# Altium footprint library PART.PcbLib: 407 footprints (part 22 of 26)
Each footprint in its own frame and in the unit in brackets; x right, y up, seen from the top. Pads: shape width x height; smd on the part's side, far side on the other; paste and mask are expansions set on the pad; w line width, h text height; cw(c..) or ccw(c..) is an arc to the next point about the centre after c.
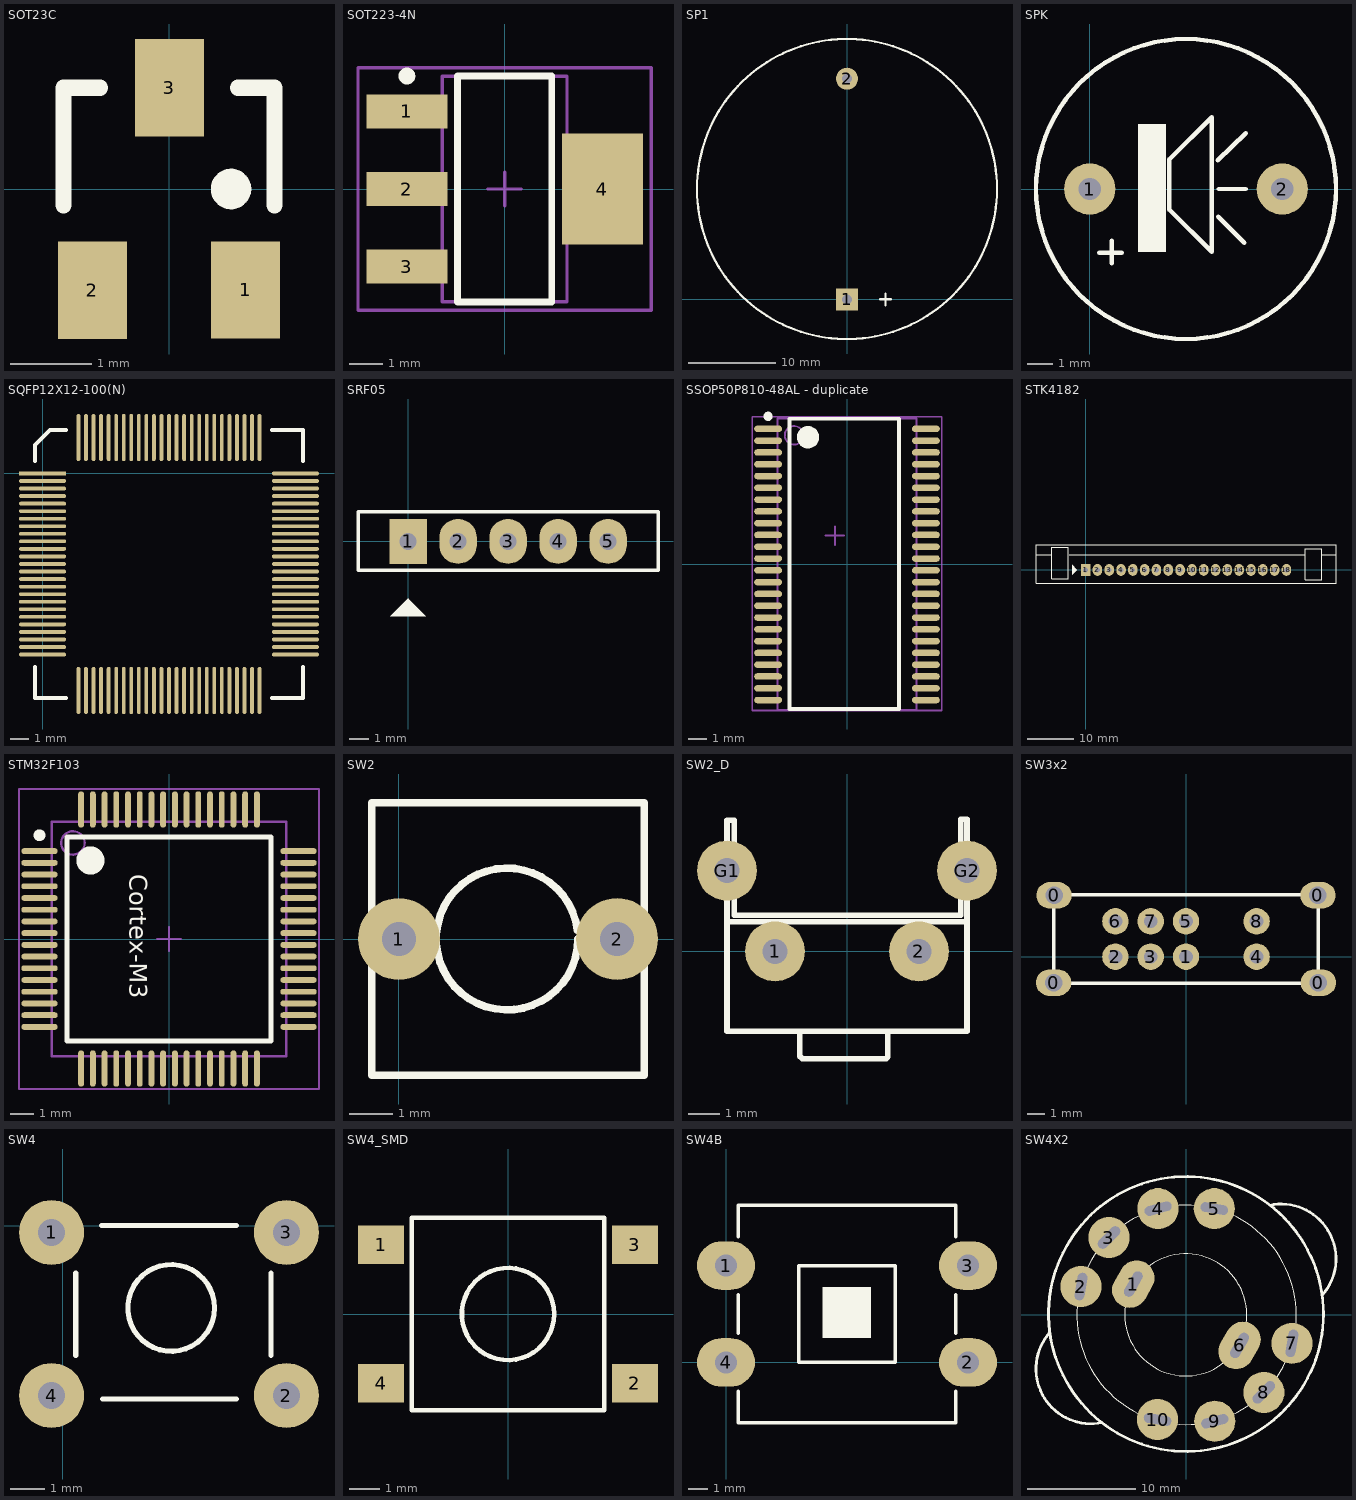
[diagram p21: the footprints below, top view; thin cyan lines are the x and y axes]

## SOT23C [mm] "SOT 23C - 2-3-1 - BCE"
height 1.27
pads (3):
  rect 0.85x1.2 smd: 1(0.94,-1.245) 2(-0.95,-1.25) 3(0,1.25)
Top Overlay:
  circle w0.25: c0.76,0 r0.125
  lines w0.2: -1.305,-0.2 -1.305,1.25 -0.855,1.25 ; 0.845,1.25 1.295,1.25 1.295,-0.2
3D body: height 1.27, standoff 0, extent 0.844,-0.376 1.295,1.251
3D body: height 1.27, standoff 0, extent -1.306,-0.376 -0.855,1.251

## SOT223-4N [mm] "SOT223, 4-Leads, Body 6.5x3.5mm, Pitch 2.3mm, Lead Span 7mm, IPC Medium Density"
height 1.8
pads (4):
  rect 2.4x1 smd: 1(-2.9,2.3) 2(-2.9,0) 3(-2.9,-2.3)
  rect 2.4x3.3 smd: 4(2.9,0)
Top Overlay:
  circle w0.25: c-2.9,3.35 r0.125
  lines w0.2: -1.4,-3.35 1.4,-3.35 1.4,3.35 -1.4,3.35 -1.4,-3.35
Mechanical 13:
  lines w0.1: -1.85,-3.35 1.85,-3.35 1.85,3.35 -1.85,3.35 -1.85,-3.35
Mechanical 15:
  lines w0.1: -0.5,0 0.5,0 ; 0,-0.5 0,0.5 ; -4.35,-3.6 4.35,-3.6 4.35,3.6 -4.35,3.6 -4.35,-3.6
3D body: height 1.8, standoff 0, extent -1.85,-3.35 1.85,3.35

## SP1 [mil] "Speaker Telphone on Broad"
height 3
pads (2):
  rect 100x100 hole 45: 1(0,0)
  round 100 hole 45: 2(0,1000)
Top Overlay:
  circle w10: c0,500 r680
  lines w10: 150,0 200,0 ; 174,-28 174,26

## SPK [mil] "Speaker Chip"
height 500
pads (2):
  round 80 hole 35: 1(0,0) 2(300,0)
Top Overlay:
  circle w7: c150,0 r233.73
  rectangle: 75,-98 119,101
  lines w7: 15,-99 50,-99 ; 34,-116 34,-81 ; 199.52,44.52 243,87 ; 200,-43 241,-84 ; 201,0 243,0 ; 124,-32 124,46 190,112 190,-98 124,-32

## SQFP12X12-100(N) [mm]
pads (100):
  rect 2.5x0.2 smd: 1(0,0)
  oval 2.5x0.2 smd: 2(0,-0.4) 3(0,-0.8) 4(0,-1.2) 5(0,-1.6) 6(0,-2) 7(0,-2.4) 8(0,-2.8) 9(0,-3.2) 10(0,-3.6) 11(0,-4) 12(0,-4.4) 13(0,-4.8) 14(0,-5.2) 15(0,-5.6) 16(0,-6) 17(0,-6.4) 18(0,-6.8) 19(0,-7.2) 20(0,-7.6) 21(0,-8) 22(0,-8.4) 23(0,-8.8) 24(0,-9.2) 25(0,-9.6) 51(13.4,-9.6) 52(13.4,-9.2) 53(13.4,-8.8) 54(13.4,-8.4) 55(13.4,-8) 56(13.4,-7.6) 57(13.4,-7.2) 58(13.4,-6.8) 59(13.4,-6.4) 60(13.4,-6) 61(13.4,-5.6) 62(13.4,-5.2) 63(13.4,-4.8) 64(13.4,-4.4) 65(13.4,-4) 66(13.4,-3.6) 67(13.4,-3.2) 68(13.4,-2.8) 69(13.4,-2.4) 70(13.4,-2) 71(13.4,-1.6) 72(13.4,-1.2) 73(13.4,-0.8) 74(13.4,-0.4) 75(13.4,0)
  oval 0.2x2.5 smd: 26(1.9,-11.5) 27(2.3,-11.5) 28(2.7,-11.5) 29(3.1,-11.5) 30(3.5,-11.5) 31(3.9,-11.5) 32(4.3,-11.5) 33(4.7,-11.5) 34(5.1,-11.5) 35(5.5,-11.5) 36(5.9,-11.5) 37(6.3,-11.5) 38(6.7,-11.5) 39(7.1,-11.5) 40(7.5,-11.5) 41(7.9,-11.5) 42(8.3,-11.5) 43(8.7,-11.5) 44(9.1,-11.5) 45(9.5,-11.5) 46(9.9,-11.5) 47(10.3,-11.5) 48(10.7,-11.5) 49(11.1,-11.5) 50(11.5,-11.5) 76(11.5,1.9) 77(11.1,1.9) 78(10.7,1.9) 79(10.3,1.9) 80(9.9,1.9) 81(9.5,1.9) 82(9.1,1.9) 83(8.7,1.9) 84(8.3,1.9) 85(7.9,1.9) 86(7.5,1.9) 87(7.1,1.9) 88(6.7,1.9) 89(6.3,1.9) 90(5.9,1.9) 91(5.5,1.9) 92(5.1,1.9) 93(4.7,1.9) 94(4.3,1.9) 95(3.9,1.9) 96(3.5,1.9) 97(3.1,1.9) 98(2.7,1.9) 99(2.3,1.9) 100(1.9,1.9)
Top Overlay:
  lines w0.2: -0.4,-10.25 -0.4,-11.9 1.25,-11.9 ; -0.4,0.65 -0.4,1.5 0.4,2.3 1.25,2.3 ; 12.15,-11.9 13.8,-11.9 13.8,-10.25 ; 12.15,2.3 13.8,2.3 13.8,0.65

## SRF05 [mil] "CON5"
height 200
pads (5):
  rect 75x90 hole 34: 1(0,0)
  oval 75x90 hole 34: 2(100,0) 3(200,0) 4(300,0) 5(400,0)
Top Overlay:
  region: -35.5,-149.5 35.5,-149.5 0.5,-114.5 0.5,-113.5
  lines w7: -100,-58 500,-58 500,0 500,59 -100,59 -100,-58

## SSOP50P810-48AL - duplicate [mm] "SSOP, 48-Leads, Body 16.0x7.5mm, Pitch 0.635mm, IPC High Density"
height 2.8
pads (48):
  oval 1.5x0.35 smd: 1(-4.25,7.302) 2(-4.25,6.667) 3(-4.25,6.032) 4(-4.25,5.397) 5(-4.25,4.763) 6(-4.25,4.127) 7(-4.25,3.492) 8(-4.25,2.857) 9(-4.25,2.222) 10(-4.25,1.587) 11(-4.25,0.953) 12(-4.25,0.318) 13(-4.25,-0.318) 14(-4.25,-0.953) 15(-4.25,-1.587) 16(-4.25,-2.222) 17(-4.25,-2.857) 18(-4.25,-3.492) 19(-4.25,-4.127) 20(-4.25,-4.763) 21(-4.25,-5.397) 22(-4.25,-6.032) 23(-4.25,-6.667) 24(-4.25,-7.302) 25(4.25,-7.302) 26(4.25,-6.667) 27(4.25,-6.032) 28(4.25,-5.397) 29(4.25,-4.763) 30(4.25,-4.127) 31(4.25,-3.492) 32(4.25,-2.857) 33(4.25,-2.222) 34(4.25,-1.587) 35(4.25,-0.953) 36(4.25,-0.318) 37(4.25,0.318) 38(4.25,0.953) 39(4.25,1.587) 40(4.25,2.222) 41(4.25,2.857) 42(4.25,3.492) 43(4.25,4.127) 44(4.25,4.763) 45(4.25,5.397) 46(4.25,6.032) 47(4.25,6.667) 48(4.25,7.302)
Top Overlay:
  circle w0.25: c-4.25,7.977 r0.125
  circle w0.6: c-2.1,6.853 r0.3
  lines w0.2: 2.786,-7.785 -3.1,-7.785 -3.1,7.852 2.786,7.852 ; 2.8,-7.785 2.8,7.852
Mechanical 13:
  circle w0.1: c-2.85,6.953 r0.5
  lines w0.1: 3.75,-7.836 3.75,7.852 ; 3.751,-7.836 -3.75,-7.836 -3.75,7.852 3.751,7.852
Mechanical 15:
  lines w0.1: -1.15,1.552 -0.15,1.552 ; -0.65,1.052 -0.65,2.053 ; 5.097,-7.861 -5.1,-7.861 -5.1,7.953 5.097,7.953 ; 5.1,-7.861 5.1,7.953
3D body: height 1.2, standoff 0, extent -3.743,-7.836 3.751,7.861

## STK4182 [mil] "Pin to pin 100mil, 18 pin"
pads (18):
  rect 80x100 hole 40: 1(0,0)
  oval 80x100 hole 40: 2(100,0) 3(200,0) 4(300,0) 5(400,0) 6(500,0) 7(600,0) 8(700,0) 9(800,0) 10(900,0) 11(1000,0) 12(1100,0) 13(1200,0) 14(1300,0) 15(1400,0) 16(1500,0) 17(1600,0) 18(1700,0)
Top Overlay:
  region: -115,42.5 -115,-42.5 -75,-2.5 -75,2.5
  lines w10: -420,130 -285,130 ; -140,130 1860,130 ; 2000,130 2120,130 ; -420,-115 2120,-115 2120,215 -420,215 -420,-115 ; -285,-75 -285,190 -145,190 -145,-75 -285,-75 ; 1860,-85 2000,-85 2000,180 1860,180 1860,-85

## STM32F103 [mm]
pads (64):
  oval 1.55x0.25 smd: 1(-5.525,3.75) 2(-5.525,3.25) 3(-5.525,2.75) 4(-5.525,2.25) 5(-5.525,1.75) 6(-5.525,1.25) 7(-5.525,0.75) 8(-5.525,0.25) 9(-5.525,-0.25) 10(-5.525,-0.75) 11(-5.525,-1.25) 12(-5.525,-1.75) 13(-5.525,-2.25) 14(-5.525,-2.75) 15(-5.525,-3.25) 16(-5.525,-3.75) 33(5.525,-3.75) 34(5.525,-3.25) 35(5.525,-2.75) 36(5.525,-2.25) 37(5.525,-1.75) 38(5.525,-1.25) 39(5.525,-0.75) 40(5.525,-0.25) 41(5.525,0.25) 42(5.525,0.75) 43(5.525,1.25) 44(5.525,1.75) 45(5.525,2.25) 46(5.525,2.75) 47(5.525,3.25) 48(5.525,3.75)
  oval 0.25x1.55 smd: 17(-3.75,-5.525) 18(-3.25,-5.525) 19(-2.75,-5.525) 20(-2.25,-5.525) 21(-1.75,-5.525) 22(-1.25,-5.525) 23(-0.75,-5.525) 24(-0.25,-5.525) 25(0.25,-5.525) 26(0.75,-5.525) 27(1.25,-5.525) 28(1.75,-5.525) 29(2.25,-5.525) 30(2.75,-5.525) 31(3.25,-5.525) 32(3.75,-5.525) 49(3.75,5.525) 50(3.25,5.525) 51(2.75,5.525) 52(2.25,5.525) 53(1.75,5.525) 54(1.25,5.525) 55(0.75,5.525) 56(0.25,5.525) 57(-0.25,5.525) 58(-0.75,5.525) 59(-1.25,5.525) 60(-1.75,5.525) 61(-2.25,5.525) 62(-2.75,5.525) 63(-3.25,5.525) 64(-3.75,5.525)
Top Overlay:
  circle w0.6: c-3.35,3.35 r0.3
  circle w0.25: c-5.525,4.425 r0.125
  lines w0.2: -4.35,-4.35 4.35,-4.35 4.35,4.35 -4.35,4.35 -4.35,-4.35
  text "Cortex-M3" at -1.93,2.769 h1.27
Mechanical 13:
  circle w0.1: c-4.1,4.1 r0.5
  lines w0.1: -5,-5 5,-5 5,5 -5,5 -5,-5
Mechanical 15:
  lines w0.1: -0.5,0 0.5,0 ; 0,-0.5 0,0.5 ; -6.4,-6.4 6.4,-6.4 6.4,6.4 -6.4,6.4 -6.4,-6.4
3D body: height 0.94, standoff 0.89, extent 0.813,1.016 2.438,2.616
3D body: height 0.94, standoff 0.89, extent 0.819,-0.627 2.455,0.848
3D body: height 0.94, standoff 0.89, extent 0.813,-2.337 2.438,-0.838
3D body: height 0.89, standoff 0.25, extent -5.013,-5.011 5.036,4.999
3D body: height 1.27, standoff 0.51, extent -4.441,3.558 -3.683,4.316
3D body: height 0.56, standoff 0.41, extent -3.962,4.928 -3.556,5.309
3D body: height 0.56, standoff 0, extent -3.859,5.309 -3.634,5.403
3D body: height 0.13, standoff 0, extent -3.859,5.403 -3.633,6.053
3D body: height 0.13, standoff 0, extent -3.358,5.389 -3.133,6.038
3D body: height 0.56, standoff 0, extent -3.358,5.294 -3.133,5.389
3D body: height 0.56, standoff 0.41, extent -3.462,4.913 -3.055,5.294
3D body: height 0.13, standoff 0, extent -2.861,5.389 -2.635,6.038
3D body: height 0.56, standoff 0, extent -2.861,5.294 -2.636,5.389
3D body: height 0.56, standoff 0.41, extent -2.964,4.913 -2.558,5.294
3D body: height 0.13, standoff 0, extent -2.364,5.389 -2.138,6.038
3D body: height 0.56, standoff 0, extent -2.364,5.294 -2.139,5.389
3D body: height 0.56, standoff 0.41, extent -2.467,4.913 -2.061,5.294
3D body: height 0.13, standoff 0, extent -1.853,5.389 -1.627,6.038
3D body: height 0.56, standoff 0, extent -1.853,5.294 -1.628,5.389
3D body: height 0.56, standoff 0.41, extent -1.957,4.913 -1.55,5.294
3D body: height 0.13, standoff 0, extent -1.376,5.395 -1.15,6.045
3D body: height 0.56, standoff 0, extent -1.376,5.3 -1.151,5.395
3D body: height 0.56, standoff 0.41, extent -1.479,4.919 -1.073,5.3
3D body: height 0.13, standoff 0, extent -0.865,5.402 -0.64,6.052
3D body: height 0.56, standoff 0, extent -0.865,5.307 -0.64,5.402
3D body: height 0.56, standoff 0.41, extent -0.969,4.926 -0.562,5.307
3D body: height 0.13, standoff 0, extent -0.361,5.395 -0.135,6.045
3D body: height 0.56, standoff 0, extent -0.361,5.3 -0.136,5.395
3D body: height 0.56, standoff 0.41, extent -0.465,4.919 -0.058,5.3
3D body: height 0.13, standoff 0, extent 0.633,5.402 0.859,6.052
3D body: height 0.56, standoff 0, extent 0.633,5.307 0.858,5.402
3D body: height 0.56, standoff 0.41, extent 0.53,4.926 0.936,5.307
3D body: height 0.13, standoff 0, extent 0.154,5.378 0.38,6.027
3D body: height 0.56, standoff 0, extent 0.154,5.283 0.379,5.378
3D body: height 0.56, standoff 0.41, extent 0.051,4.902 0.457,5.283
3D body: height 0.13, standoff 0, extent 1.119,5.403 1.345,6.053
3D body: height 0.56, standoff 0, extent 1.119,5.309 1.344,5.403
3D body: height 0.56, standoff 0.41, extent 1.016,4.928 1.422,5.309
3D body: height 0.13, standoff 0, extent 1.627,5.378 1.853,6.027
3D body: height 0.56, standoff 0, extent 1.627,5.283 1.852,5.378
3D body: height 0.56, standoff 0.41, extent 1.524,4.902 1.93,5.283
3D body: height 0.13, standoff 0, extent 2.135,5.378 2.361,6.027
3D body: height 0.56, standoff 0, extent 2.135,5.283 2.36,5.378
3D body: height 0.56, standoff 0.41, extent 2.032,4.902 2.438,5.283
3D body: height 0.13, standoff 0, extent 2.618,5.378 2.844,6.027
3D body: height 0.56, standoff 0, extent 2.618,5.283 2.843,5.378
3D body: height 0.56, standoff 0.41, extent 2.515,4.902 2.921,5.283
3D body: height 0.13, standoff 0, extent 3.126,5.378 3.352,6.027
3D body: height 0.56, standoff 0, extent 3.126,5.283 3.351,5.378
3D body: height 0.56, standoff 0.41, extent 3.023,4.902 3.429,5.283
3D body: height 0.56, standoff 0.41, extent 3.531,4.902 3.937,5.283
3D body: height 0.56, standoff 0, extent 3.634,5.283 3.859,5.378
3D body: height 0.13, standoff 0, extent 3.634,5.378 3.86,6.027
3D body: height 0.13, standoff 0, extent 5.454,-3.86 6.104,-3.634
3D body: height 0.56, standoff 0, extent 5.359,-3.859 5.454,-3.634
3D body: height 0.56, standoff 0.41, extent 4.978,-3.937 5.359,-3.531
3D body: height 0.56, standoff 0.41, extent 4.978,-3.429 5.359,-3.023
3D body: height 0.56, standoff 0, extent 5.359,-3.351 5.454,-3.126
3D body: height 0.13, standoff 0, extent 5.454,-3.352 6.104,-3.126
3D body: height 0.56, standoff 0.41, extent 4.978,-2.921 5.359,-2.515
3D body: height 0.56, standoff 0, extent 5.359,-2.843 5.454,-2.618
3D body: height 0.13, standoff 0, extent 5.454,-2.844 6.104,-2.618
3D body: height 0.56, standoff 0.41, extent 4.978,-2.438 5.359,-2.032
3D body: height 0.56, standoff 0, extent 5.359,-2.36 5.454,-2.135
3D body: height 0.13, standoff 0, extent 5.454,-2.361 6.104,-2.135
3D body: height 0.56, standoff 0.41, extent 4.978,-1.93 5.359,-1.524
3D body: height 0.56, standoff 0, extent 5.359,-1.852 5.454,-1.627
3D body: height 0.13, standoff 0, extent 5.454,-1.853 6.104,-1.627
3D body: height 0.56, standoff 0.41, extent 5.004,-1.422 5.385,-1.016
3D body: height 0.56, standoff 0, extent 5.385,-1.344 5.48,-1.119
3D body: height 0.13, standoff 0, extent 5.48,-1.345 6.129,-1.119
3D body: height 0.56, standoff 0.41, extent 4.978,-0.457 5.359,-0.051
3D body: height 0.56, standoff 0, extent 5.359,-0.379 5.454,-0.154
3D body: height 0.13, standoff 0, extent 5.454,-0.38 6.104,-0.154
3D body: height 0.56, standoff 0.41, extent 5.003,-0.936 5.384,-0.53
3D body: height 0.56, standoff 0, extent 5.384,-0.858 5.478,-0.633
3D body: height 0.13, standoff 0, extent 5.478,-0.859 6.128,-0.633
3D body: height 0.56, standoff 0.41, extent 4.996,0.058 5.377,0.465
3D body: height 0.56, standoff 0, extent 5.377,0.136 5.471,0.361
3D body: height 0.13, standoff 0, extent 5.471,0.135 6.121,0.361
3D body: height 0.56, standoff 0.41, extent 5.003,0.562 5.384,0.969
3D body: height 0.56, standoff 0, extent 5.384,0.64 5.478,0.865
3D body: height 0.13, standoff 0, extent 5.478,0.64 6.128,0.865
3D body: height 0.56, standoff 0.41, extent 4.996,1.073 5.377,1.479
3D body: height 0.56, standoff 0, extent 5.377,1.151 5.471,1.376
3D body: height 0.13, standoff 0, extent 5.471,1.15 6.121,1.376
3D body: height 0.56, standoff 0.41, extent 4.989,1.55 5.37,1.957
3D body: height 0.56, standoff 0, extent 5.37,1.628 5.465,1.853
3D body: height 0.13, standoff 0, extent 5.465,1.627 6.114,1.853
3D body: height 0.56, standoff 0.41, extent 4.989,2.061 5.37,2.467
3D body: height 0.56, standoff 0, extent 5.37,2.139 5.465,2.364
3D body: height 0.13, standoff 0, extent 5.465,2.138 6.114,2.364
3D body: height 0.56, standoff 0.41, extent 4.989,2.558 5.37,2.964
3D body: height 0.56, standoff 0, extent 5.37,2.636 5.465,2.861
3D body: height 0.13, standoff 0, extent 5.465,2.635 6.114,2.861
3D body: height 0.56, standoff 0.41, extent 4.989,3.055 5.37,3.462
3D body: height 0.56, standoff 0, extent 5.37,3.133 5.465,3.358
3D body: height 0.13, standoff 0, extent 5.465,3.133 6.114,3.358
3D body: height 0.13, standoff 0, extent 5.48,3.633 6.129,3.859
3D body: height 0.56, standoff 0, extent 5.385,3.634 5.48,3.859
3D body: height 0.56, standoff 0.41, extent 5.004,3.556 5.385,3.962
3D body: height 0.13, standoff 0, extent -3.86,-6.053 -3.634,-5.403
3D body: height 0.56, standoff 0, extent -3.859,-5.403 -3.634,-5.309
3D body: height 0.56, standoff 0.41, extent -3.937,-5.309 -3.531,-4.928
3D body: height 0.56, standoff 0.41, extent -3.429,-5.309 -3.023,-4.928
3D body: height 0.56, standoff 0, extent -3.351,-5.403 -3.126,-5.309
3D body: height 0.13, standoff 0, extent -3.352,-6.053 -3.126,-5.403
3D body: height 0.56, standoff 0.41, extent -2.921,-5.309 -2.515,-4.928
3D body: height 0.56, standoff 0, extent -2.843,-5.403 -2.618,-5.309
3D body: height 0.13, standoff 0, extent -2.844,-6.053 -2.618,-5.403
3D body: height 0.56, standoff 0.41, extent -2.438,-5.309 -2.032,-4.928
3D body: height 0.56, standoff 0, extent -2.36,-5.403 -2.135,-5.309
3D body: height 0.13, standoff 0, extent -2.361,-6.053 -2.135,-5.403
3D body: height 0.56, standoff 0.41, extent -1.93,-5.309 -1.524,-4.928
3D body: height 0.56, standoff 0, extent -1.852,-5.403 -1.627,-5.309
3D body: height 0.13, standoff 0, extent -1.853,-6.053 -1.627,-5.403
3D body: height 0.56, standoff 0.41, extent -1.422,-5.334 -1.016,-4.953
3D body: height 0.56, standoff 0, extent -1.344,-5.429 -1.119,-5.334
3D body: height 0.13, standoff 0, extent -1.345,-6.078 -1.119,-5.429
3D body: height 0.56, standoff 0.41, extent -0.457,-5.309 -0.051,-4.928
3D body: height 0.56, standoff 0, extent -0.379,-5.403 -0.154,-5.309
3D body: height 0.13, standoff 0, extent -0.38,-6.053 -0.154,-5.403
3D body: height 0.56, standoff 0.41, extent -0.936,-5.333 -0.53,-4.952
3D body: height 0.56, standoff 0, extent -0.858,-5.427 -0.633,-5.333
3D body: height 0.13, standoff 0, extent -0.859,-6.077 -0.633,-5.427
3D body: height 0.56, standoff 0.41, extent 0.058,-5.326 0.465,-4.945
3D body: height 0.56, standoff 0, extent 0.136,-5.421 0.361,-5.326
3D body: height 0.13, standoff 0, extent 0.135,-6.07 0.361,-5.421
3D body: height 0.56, standoff 0.41, extent 0.562,-5.333 0.969,-4.952
3D body: height 0.56, standoff 0, extent 0.64,-5.427 0.865,-5.333
3D body: height 0.13, standoff 0, extent 0.64,-6.077 0.865,-5.427
3D body: height 0.56, standoff 0.41, extent 1.073,-5.326 1.479,-4.945
3D body: height 0.56, standoff 0, extent 1.151,-5.421 1.376,-5.326
3D body: height 0.13, standoff 0, extent 1.15,-6.07 1.376,-5.421
3D body: height 0.56, standoff 0.41, extent 1.55,-5.319 1.957,-4.938
3D body: height 0.56, standoff 0, extent 1.628,-5.414 1.853,-5.319
3D body: height 0.13, standoff 0, extent 1.627,-6.063 1.853,-5.414
3D body: height 0.56, standoff 0.41, extent 2.061,-5.319 2.467,-4.938
3D body: height 0.56, standoff 0, extent 2.139,-5.414 2.364,-5.319
3D body: height 0.13, standoff 0, extent 2.138,-6.063 2.364,-5.414
3D body: height 0.56, standoff 0.41, extent 2.558,-5.319 2.964,-4.938
3D body: height 0.56, standoff 0, extent 2.636,-5.414 2.861,-5.319
3D body: height 0.13, standoff 0, extent 2.635,-6.063 2.861,-5.414
3D body: height 0.56, standoff 0.41, extent 3.055,-5.319 3.462,-4.938
3D body: height 0.56, standoff 0, extent 3.133,-5.414 3.358,-5.319
3D body: height 0.13, standoff 0, extent 3.133,-6.063 3.358,-5.414
3D body: height 0.13, standoff 0, extent 3.633,-6.078 3.859,-5.429
3D body: height 0.56, standoff 0, extent 3.634,-5.429 3.859,-5.334
3D body: height 0.56, standoff 0.41, extent 3.556,-5.334 3.962,-4.953
3D body: height 0.13, standoff 0, extent -6.053,3.634 -5.403,3.86
3D body: height 0.56, standoff 0, extent -5.403,3.634 -5.309,3.859
3D body: height 0.56, standoff 0.41, extent -5.309,3.531 -4.928,3.937
3D body: height 0.56, standoff 0.41, extent -5.309,3.023 -4.928,3.429
3D body: height 0.56, standoff 0, extent -5.403,3.126 -5.309,3.351
3D body: height 0.13, standoff 0, extent -6.053,3.126 -5.403,3.352
3D body: height 0.56, standoff 0.41, extent -5.309,2.515 -4.928,2.921
3D body: height 0.56, standoff 0, extent -5.403,2.618 -5.309,2.843
3D body: height 0.13, standoff 0, extent -6.053,2.618 -5.403,2.844
3D body: height 0.56, standoff 0.41, extent -5.309,2.032 -4.928,2.438
3D body: height 0.56, standoff 0, extent -5.403,2.135 -5.309,2.36
3D body: height 0.13, standoff 0, extent -6.053,2.135 -5.403,2.361
3D body: height 0.56, standoff 0.41, extent -5.309,1.524 -4.928,1.93
3D body: height 0.56, standoff 0, extent -5.403,1.627 -5.309,1.852
3D body: height 0.13, standoff 0, extent -6.053,1.627 -5.403,1.853
3D body: height 0.56, standoff 0.41, extent -5.334,1.016 -4.953,1.422
3D body: height 0.56, standoff 0, extent -5.429,1.119 -5.334,1.344
3D body: height 0.13, standoff 0, extent -6.078,1.119 -5.429,1.345
3D body: height 0.56, standoff 0.41, extent -5.309,0.051 -4.928,0.457
3D body: height 0.56, standoff 0, extent -5.403,0.154 -5.309,0.379
3D body: height 0.13, standoff 0, extent -6.053,0.154 -5.403,0.38
3D body: height 0.56, standoff 0.41, extent -5.333,0.53 -4.952,0.936
3D body: height 0.56, standoff 0, extent -5.427,0.633 -5.333,0.858
3D body: height 0.13, standoff 0, extent -6.077,0.633 -5.427,0.859
3D body: height 0.56, standoff 0.41, extent -5.326,-0.465 -4.945,-0.058
3D body: height 0.56, standoff 0, extent -5.421,-0.361 -5.326,-0.136
3D body: height 0.13, standoff 0, extent -6.07,-0.361 -5.421,-0.135
3D body: height 0.56, standoff 0.41, extent -5.333,-0.969 -4.952,-0.562
3D body: height 0.56, standoff 0, extent -5.427,-0.865 -5.333,-0.64
3D body: height 0.13, standoff 0, extent -6.077,-0.865 -5.427,-0.64
3D body: height 0.56, standoff 0.41, extent -5.326,-1.479 -4.945,-1.073
3D body: height 0.56, standoff 0, extent -5.421,-1.376 -5.326,-1.151
3D body: height 0.13, standoff 0, extent -6.07,-1.376 -5.421,-1.15
3D body: height 0.56, standoff 0.41, extent -5.319,-1.957 -4.938,-1.55
3D body: height 0.56, standoff 0, extent -5.414,-1.853 -5.319,-1.628
3D body: height 0.13, standoff 0, extent -6.063,-1.853 -5.414,-1.627
3D body: height 0.56, standoff 0.41, extent -5.319,-2.467 -4.938,-2.061
3D body: height 0.56, standoff 0, extent -5.414,-2.364 -5.319,-2.139
3D body: height 0.13, standoff 0, extent -6.063,-2.364 -5.414,-2.138
3D body: height 0.56, standoff 0.41, extent -5.319,-2.964 -4.938,-2.558
3D body: height 0.56, standoff 0, extent -5.414,-2.861 -5.319,-2.636
3D body: height 0.13, standoff 0, extent -6.063,-2.861 -5.414,-2.635
3D body: height 0.56, standoff 0.41, extent -5.319,-3.462 -4.938,-3.055
3D body: height 0.56, standoff 0, extent -5.414,-3.358 -5.319,-3.133
3D body: height 0.13, standoff 0, extent -6.063,-3.358 -5.414,-3.133
3D body: height 0.13, standoff 0, extent -6.078,-3.859 -5.429,-3.633
3D body: height 0.56, standoff 0, extent -5.429,-3.859 -5.334,-3.634
3D body: height 0.56, standoff 0.41, extent -5.334,-3.962 -4.953,-3.556

## SW2 [mil] "SW button 2pin, 250x 250 mil"
height 100
pads (2):
  round 75 hole 31: 1(0,0) 2(200,0)
Top Overlay:
  lines w7: 163.64,8.26 ccw(c99.17,0) 164.17,0 ; -25,-125 -25,125 225,125 225,-125 -25,-125
3D body: height 275.59, standoff -137.8, extent -46,-125 265.02,119.09

## SW2_D [mil] "SW button 2pin, 300x 300 x 250 mil"
height 100
pads (4):
  round 75 hole 31: 1(-90,0) 2(90,0) G1(-150,101) G2(150,101)
Top Overlay:
  lines w7: -150,37 150,37 ; -59,-100 -59,-131 -56,-134 49,-134 51,-132 51,-100 ; -150,-100 -150,164 -141,164 -141,45 142,45 142,165 150,165 150,-100 -150,-100

## SW3x2 [mil] "Switch 3x2 - pin to pin 80"
height 500
pads (12):
  oval 80x60 hole 40: 0(-300,-59) 0(-299,139) 0(299,139) 0(300,-59)
  round 60 hole 31: 1(0,0) 2(-160,0) 3(-80,0) 4(160,0) 5(0,80) 6(-160,80) 7(-80,80) 8(160,80)
Top Overlay:
  lines w8: -300,-60 -300,140 300,140 300,-60 -300,-60

## SW4 [mil] "SW button 4pin, 250 x250 mil"
height 100
pads (4):
  round 75 hole 31: 1(-13,-8) 2(258,-196) 3(258,-8) 4(-13,-196)
Top Overlay:
  circle w6: c125,-95 r50
  lines w6: 15,-150 15,-55 ; 45,0 200,0 ; 46,-200 200,-200 ; 240,-150 240,-55
  lines w7: 239,-215 240,-214
3D body: height 275.59, standoff -137.8, extent -30.51,-225 280.51,19.09

## SW4_SMD [mil] "SW SMD button 4pin, 250 x250 mil"
height 100
pads (4):
  rect 60x50 smd: 1(-165,90) 2(165,-90) 3(165,90) 4(-165,-90)
Top Overlay:
  circle w6: c0,0 r60
  lines w6: -125,-125 125,-125 125,125 -125,125 -125,-125
3D body: height 20, standoff 0, extent -180,-105 -125,-75
3D body: height 20, standoff 0, extent -180,75 -125,105
3D body: height 20, standoff 0, extent 125,75 180,105
3D body: height 20, standoff 0, extent 125,-105 180,-75
3D body: height 80, standoff 10, extent -125,-125 125,125
3D body: height 130, standoff 80, extent -59.76,-59.88 59.76,59.88

## SW4B [mil] "SW button 4pin, 450 x 450 mil"
height 100
pads (4):
  oval 120x100 hole 45: 1(0,200) 2(500,0) 3(500,200) 4(0,0)
Top Overlay:
  rectangle: 199,50 300,156
  lines w7: 25,-60 25,-125 475,-125 475,-60 ; 25,60 25,140 ; 25,260 25,325 475,325 475,260 ; 475,60 475,140 ; 150,0 150,200 350,200 350,0 150,0

## SW4X2 [mil] "Switch 4x2"
height 500
pads (10):
  oval 180x130 hole 35 slot 100 at 60 deg rot 60: 1(-193.57,112.51) 6(193.7,-111.07)
  round 150 hole 35 slot 100 at 80 deg: 2(-384.48,103.48) 7(384.48,-103.48)
  round 150 hole 35 slot 100 at 45 deg: 3(-282.26,282.26) 8(282.26,-282.26)
  round 150 hole 35 slot 100 at 15 deg: 4(-103.48,387.48) 9(103.48,-387.48)
  round 150 hole 35 slot 100 at 170 deg: 5(101.54,387.46) 10(-105.2,-381.27)
Top Overlay:
  circle w1: c-2.46,0.46 r222.5
  circle w1: c0.54,0.46 r400
  circle w10: c-1.46,3.46 r501
  lines w10: -498,-63.94 ccw(c-348.29,-196.56) -307.65,-392.38 ; 303.52,399.93 cw(c345.18,204.32) 495.11,71.95